# Altium footprint library PERCRO_footprints.PcbLib: 177 footprints (part 12 of 12)
Each footprint in its own frame and in the unit in brackets; x right, y up, seen from the top. Pads: shape width x height; smd on the part's side, far side on the other; paste and mask are expansions set on the pad; w line width, h text height; cw(c..) or ccw(c..) is an arc to the next point about the centre after c.
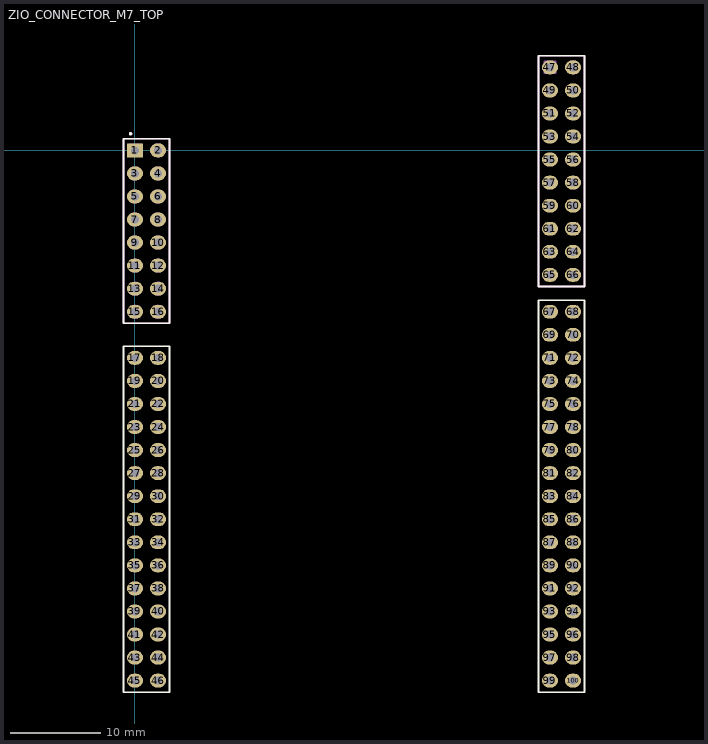
[diagram p11: the footprint, top view; thin cyan lines are the x and y axes]

## ZIO_CONNECTOR_M7_TOP [mil] "Footprint to use a PCB over the NUCLEO"
pads (100):
  rect 70x60 hole 35: 1(0,0)
  oval 70x60 hole 35: 2(100,0) 3(0,-100) 4(100,-100) 5(0,-200) 6(100,-200) 7(0,-300) 8(100,-300) 9(0,-400) 10(100,-400) 11(0,-500) 12(100,-500) 13(0,-600) 14(100,-600) 15(0,-700) 16(100,-700) 17(0,-900) 18(100,-900) 19(0,-1000) 20(100,-1000) 21(0,-1100) 22(100,-1100) 23(0,-1200) 24(100,-1200) 25(0,-1300) 26(100,-1300) 27(0,-1400) 28(100,-1400) 29(0,-1500) 30(100,-1500) 31(0,-1600) 32(100,-1600) 33(0,-1700) 34(100,-1700) 35(0,-1800) 36(100,-1800) 37(0,-1900) 38(100,-1900) 39(0,-2000) 40(100,-2000) 41(0,-2100) 42(100,-2100) 43(0,-2200) 44(100,-2200) 45(0,-2300) 46(100,-2300) 47(1800,360) 48(1900,360) 49(1800,260) 50(1900,260) 51(1800,160) 52(1900,160) 53(1800,60) 54(1900,60) 55(1800,-40) 56(1900,-40) 57(1800,-140) 58(1900,-140) 59(1800,-240) 60(1900,-240) 61(1800,-340) 62(1900,-340) 63(1800,-440) 64(1900,-440) 65(1800,-540) 66(1900,-540) 67(1800,-700) 68(1900,-700) 69(1800,-800) 70(1900,-800) 71(1800,-900) 72(1900,-900) 73(1800,-1000) 74(1900,-1000) 75(1800,-1100) 76(1900,-1100) 77(1800,-1200) 78(1900,-1200) 79(1800,-1300) 80(1900,-1300) 81(1800,-1400) 82(1900,-1400) 83(1800,-1500) 84(1900,-1500) 85(1800,-1600) 86(1900,-1600) 87(1800,-1700) 88(1900,-1700) 89(1800,-1800) 90(1900,-1800) 91(1800,-1900) 92(1900,-1900) 93(1800,-2000) 94(1900,-2000) 95(1800,-2100) 96(1900,-2100) 97(1800,-2200) 98(1900,-2200) 99(1800,-2300) 100(1900,-2300)
Top Overlay:
  circle w9.84: c-18.31,72 r2.31
  lines w7.87: -50,-2350 -50,-850 150,-850 150,-2350 -50,-2350 ; -50,-750 150,-750 150,50 -50,50 -50,-750 ; 1750,-2350 1950,-2350 1950,-650 1750,-650 1750,-2350 ; 1750,-590 1950,-590 1950,410 1750,410 1750,-590
Mechanical 7:
  circle w7.87: c100,-600 r26.93
  circle w7.87: c100,-700 r26.93
  circle w7.87: c0,-700 r26.93
  circle w7.87: c0,-600 r26.93
  circle w7.87: c0,-100 r26.93
  circle w7.87: c0,-200 r26.93
  circle w7.87: c0,-300 r26.93
  circle w7.87: c0,-400 r26.93
  circle w7.87: c0,-500 r26.93
  circle w7.87: c100,-500 r26.93
  circle w7.87: c100,-400 r26.93
  circle w7.87: c100,-300 r26.93
  circle w7.87: c100,-200 r26.93
  circle w7.87: c100,-100 r26.93
  circle w7.87: c100,0 r26.93
  circle w7.87: c1900,360 r26.93
  lines w7.87: -50,-750 150,-750 150,50 -50,50 -50,-750 ; -25,-25 -25,25 25,25 25,-25 -25,-25 ; 1750,-590 1950,-590 1950,410 1750,410 1750,-590 ; 1775,335 1825,335 1825,385 1775,385 1775,335
3D body "header_2x10.stp": height 63.98, standoff -436.02, extent 1706.3,-588.02 1948.43,411.98
3D body "header_2x15.stp": height 63.98, standoff -436.02, extent -48.42,-2351.96 193.71,-851.96
3D body "header_2x17.stp": height 63.98, standoff -436.02, extent 1706.3,-2348.02 1948.43,-648.02
3D body "header_2x8.stp": height 63.98, standoff -436.02, extent -48.42,-751.96 193.71,48.04